# Altium footprint library CMR_Connectors.PcbLib: 71 footprints (part 5 of 5)
Each footprint in its own frame and in the unit in brackets; x right, y up, seen from the top. Pads: shape width x height; smd on the part's side, far side on the other; paste and mask are expansions set on the pad; w line width, h text height; cw(c..) or ccw(c..) is an arc to the next point about the centre after c.
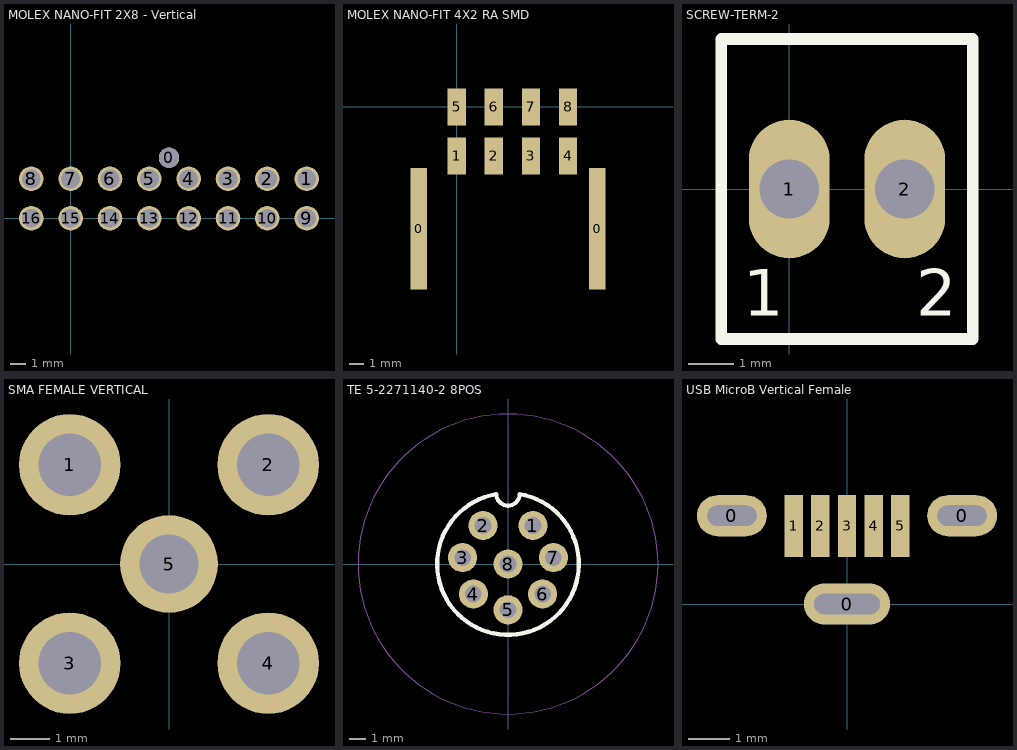
[diagram p4: the footprints below, top view; thin cyan lines are the x and y axes]

## MOLEX NANO-FIT 2X8 - Vertical [mm]
pads (17):
  round 1.3 hole 1.3: 0(6.25,3.84)
  round 1.56 hole 1.2: 1(15,2.5) 2(12.5,2.5) 3(10,2.5) 4(7.5,2.5) 5(5,2.5) 6(2.5,2.5) 7(0,2.5) 8(-2.5,2.5) 9(15,0) 10(12.5,0) 11(10,0) 12(7.5,0) 13(5,0) 14(2.5,0) 15(0,0) 16(-2.5,0)
3D body "1053102316.stp": height 10.68, standoff -3.03, extent -4.145,-1.69 16.795,7.15
3D body "1053081216.stp": height 27.85, standoff 12.15, extent -5.125,-2.535 17.575,7.925

## MOLEX NANO-FIT 4X2 RA SMD [mm]
pads (10):
  rect 1.1x8.2 smd: 0(-2.57,-8.23) 0(9.47,-8.23)
  rect 1.24x2.5 smd: 1(0,-3.3) 2(2.5,-3.3) 3(5,-3.3) 4(7.5,-3.3) 5(0,0) 6(2.5,0) 7(5,0) 8(7.5,0)
3D body "1053081208.stp": height 10.01, standoff -0.45, extent -2.55,-29.875 10.15,-14.175
3D body "1054051308.stp": height 9.5, standoff 0.01, extent -3.42,-13.975 10.32,0.765

## PCBComponent_1 [mm]

## SCREW-TERM-2 [mil]
height 400
pads (2):
  oval 70x120 hole 51.18: 1(0,0) 2(100,0)
Top Overlay:
  lines w10: -59.06,-129.92 -59.06,129.92 159.06,129.92 159.06,-129.92 -59.06,-129.92
  text "1" at -40,-110 h40
  text "2" at 110,-110 h40

## SMA FEMALE VERTICAL [mm]
pads (5):
  round 2.6 hole 1.6: 1(-2.54,2.54) 2(2.54,2.54) 3(-2.54,-2.54) 4(2.54,-2.54)
  round 2.5 hole 1.5: 5(0,0)
3D body "TEConnectivity-c-5-1814832-1-b-3d.stp": height 9.5, standoff -4, extent -3.2,-3.2 3.2,3.2

## TE 5-2271140-2 8POS [mm] "TE 8-Position rear panel mount circular connector"
pads (8):
  round 1.75 hole 1: 1(1.498,2.306) 2(-1.498,2.306) 3(-2.723,0.383) 4(-2.075,-1.804) 5(0,-2.75) 6(2.075,-1.804) 7(2.723,0.383) 8(0,0)
Top Overlay:
  lines w0.254: -0.715,4.189 ccw(c0,0) 0.699,4.192 cw(c0,4.2) -0.699,4.19
Mechanical 15:
  circle w0.051: c0,0 r9
3D body "c-5-2271140-2-a-3d.stp": height 24.05, standoff -5.05, extent -9.998,-9 9.996,8.999

## USB MicroB Vertical Female [mm]
pads (8):
  oval 1.7x1 hole 0.5 slot 1.2 at 0 deg: 0(-2.8,2.15) 0(2.8,2.15)
  oval 2.1x1 hole 0.5 slot 1.6 at 0 deg: 0(0,0)
  rect 0.45x1.5 smd: 1(-1.3,1.9) 2(-0.65,1.9) 3(0,1.9) 4(0.65,1.9) 5(1.3,1.9)
3D body "Molex1051330001.stp": height 7.73, standoff -2.07, extent -4.025,-1.125 4,3.325